# Altium footprint library PBL - THD Packages.PcbLib: 137 footprints (part 4 of 9)
Each footprint in its own frame and in the unit in brackets; x right, y up, seen from the top. Pads: shape width x height; smd on the part's side, far side on the other; paste and mask are expansions set on the pad; w line width, h text height; cw(c..) or ccw(c..) is an arc to the next point about the centre after c.
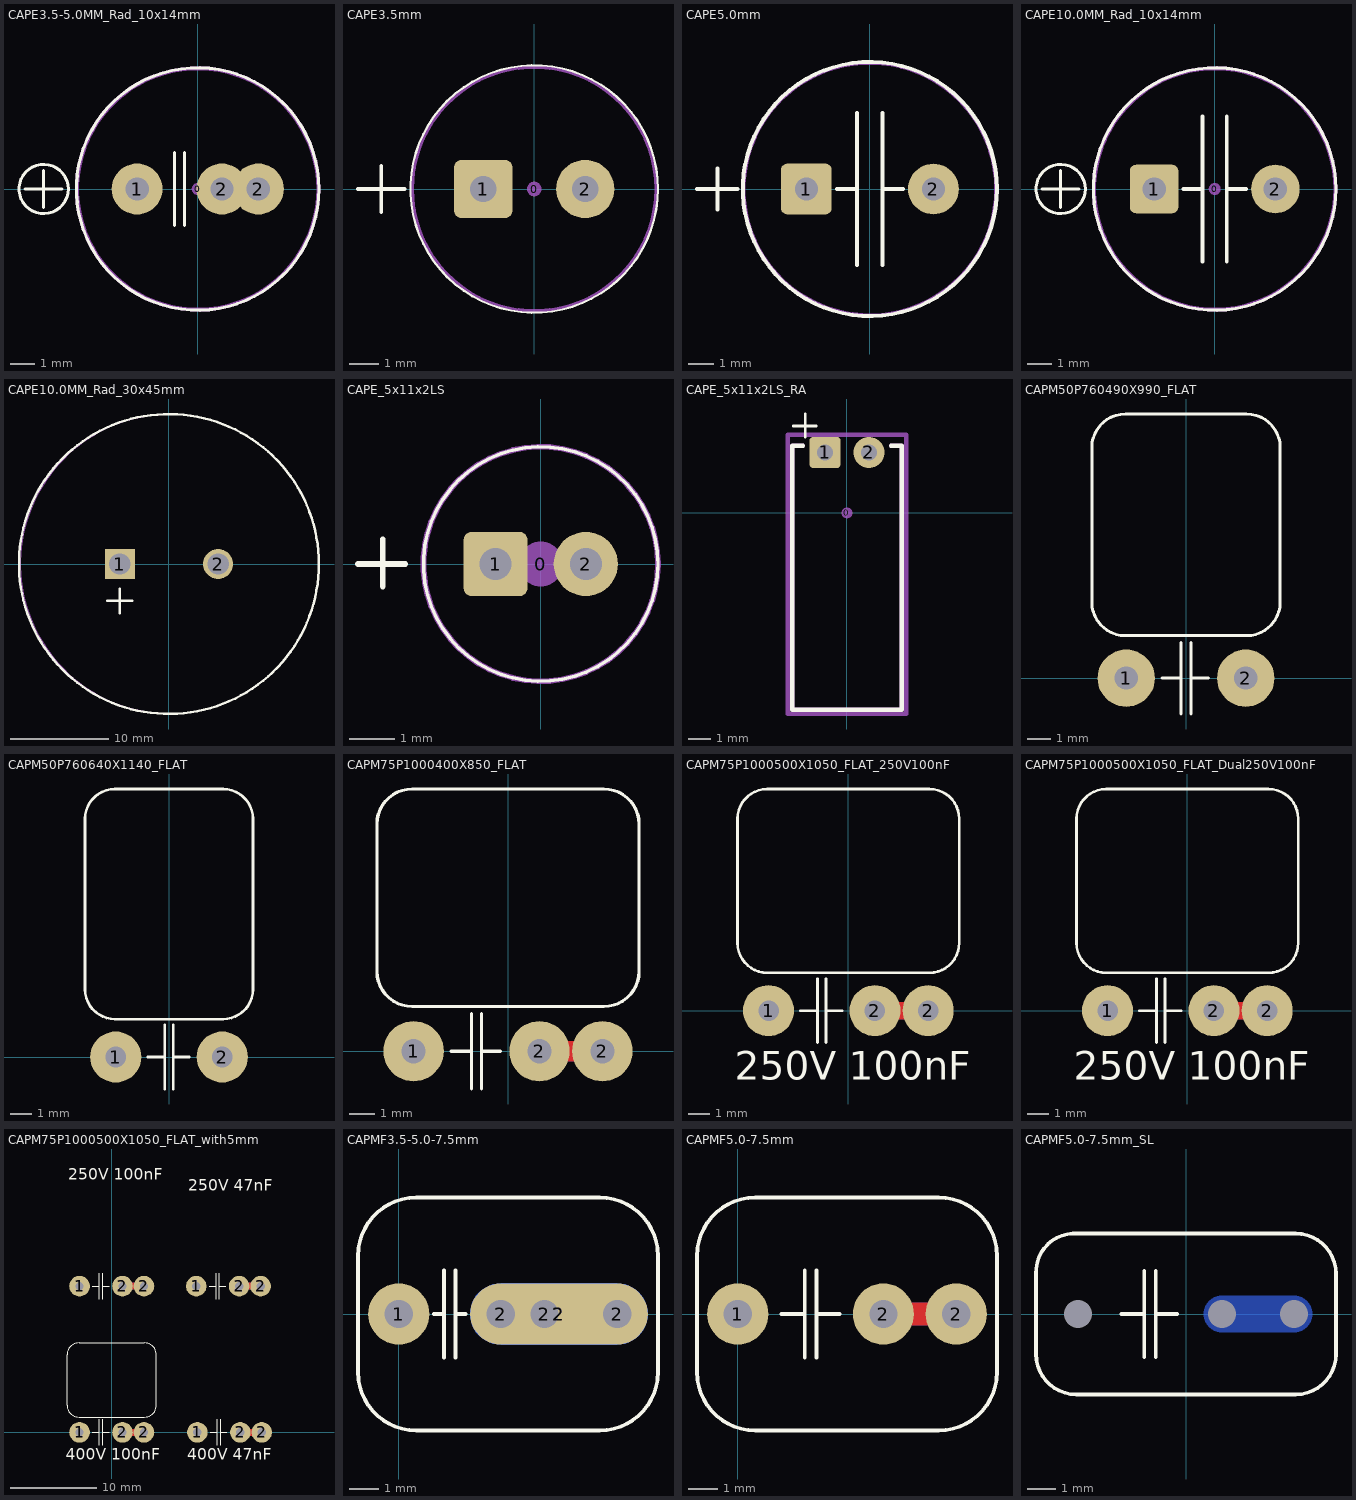
[diagram p3: the footprints below, top view; thin cyan lines are the x and y axes]

## CAPE3.5-5.0MM_Rad_10x14mm [mm] "3.5 & 5.0mm Pitch Radial Capacitor 10x14mm DxH"
height 14
pads (4):
  round 0.5 on Mech14: 0(0,0)
  round 2.1 hole 0.965: 1(-2.5,0) 2(1,0) 2(2.5,0)
Top Overlay:
  circle w0.127: c-6.35,0 r1.016
  circle w0.127: c0,0 r5
  lines w0.127: -7.112,0 -5.588,0 ; -6.35,-0.762 -6.35,0.762 ; -0.95,-1.5 -0.95,1.5 ; -0.55,-1.5 -0.55,1.5
13 - 3D:
  circle w0.127: c0,0 r4.953
14 - Courtyards Top:
  circle w0.127: c0,0 r5
3D body "ElectroCap10x14mm.stp": height 13.99, standoff -3.51, extent -5.25,-5.237 5.206,5.237

## CAPE3.5mm [mm]
pads (3):
  round 0.508 on Mech14: 0(0,0)
  rrect25% 2x2 hole 0.9: 1(-1.75,0)
  round 2 hole 0.9: 2(1.75,0)
Top Overlay:
  circle w0.076: c0,0 r4.25
  lines w0.127: -6.05,0 -4.45,0 ; -5.25,-0.8 -5.25,0.8
13 - 3D:
  circle w0.127: c0,0 r4.191
3D body: height 7.1, standoff 0.1, extent -4.25,-4.25 4.216,4.233

## CAPE5.0mm [mm]
height 20
pads (2):
  rrect25% 2x2 hole 0.9: 1(-2.5,0)
  round 2 hole 0.9: 2(2.5,0)
Top Overlay:
  circle w0.152: c0,0 r5
  lines w0.152: -6.8,0 -5.2,0 ; -6,-0.8 -6,0.8 ; -1.3,0 -0.5,0 ; -0.5,-3 -0.5,3 ; 0.5,-3 0.5,3 ; 0.5,0 1.3,0
13 - 3D:
  circle w0.127: c0,-0.003 r4.953
3D body "ElectroCap20x10mm.stp": height 20, standoff -3.5, extent -4.958,-4.968 4.953,4.961

## CAPE10.0MM_Rad_10x14mm [mm] "10mm Pitch Radial Capacitor 10x14mm DxH"
height 14
pads (3):
  round 0.5 on Mech14: 0(0,0)
  rrect25% 2x2 hole 0.965: 1(-2.5,0)
  round 2 hole 0.965: 2(2.5,0)
Top Overlay:
  circle w0.127: c0,0 r5
  circle w0.127: c-6.35,0 r1.016
  lines w0.127: -7.112,0 -5.588,0 ; -6.35,-0.762 -6.35,0.762
  lines w0.152: -1.3,0.003 -0.5,0.003 ; -0.5,-2.997 -0.5,3.003 ; 0.5,-2.997 0.5,3.003 ; 0.5,0.003 1.3,0.003
13 - 3D:
  circle w0.127: c0,0 r4.953
14 - Courtyards Top:
  circle w0.127: c0,0 r5
3D body "ElectroCap10x14mm.stp": height 13.99, standoff -3.51, extent -5.25,-5.249 5.25,5.25

## CAPE10.0MM_Rad_30x45mm [mil] "10mm Pitch Radial Capacitor"
height 1771.65
pads (2):
  rect 120x120 hole 86: 1(-196.85,0)
  round 120 hole 86: 2(196.85,0)
Top Overlay:
  circle w10: c0,0 r600.39
  lines w10: -246.06,-147.64 -147.64,-147.64 ; -196.85,-196.85 -196.85,-98.43
15 - Courtyards Bottom:
  circle w5: c3.15,0 r597.8
3D body "ElectroCap45x30mm.stp": height 1771.65, standoff -137.8, extent -590.54,-590.45 590.56,590.47

## CAPE_5x11x2LS [mil] "Capacitor, electrolytic, radial can"
height 433.07
pads (3):
  round 39.37 on Mech14: 0(0,0)
  rrect25% 56x56 hole 28: 1(-39.37,0)
  round 56 hole 28: 2(39.37,0)
Top Overlay:
  circle w3: c0,0 r102.36
  lines w5: -159.45,0 -118.11,0 ; -137.8,-19.68 -137.8,21.65
13 - 3D:
  circle w5: c0,0 r102.36
3D body "Cap, elec, radial, 5x11x2LS.STEP": height 433.07, standoff -86.61, extent -98.42,-98.42 98.43,98.43

## CAPE_5x11x2LS_RA [mil] "Capacitor, electrolytic, radial can, laid over"
height 196.85
pads (3):
  round 19.68 on Mech14: 0(0,0)
  rrect25% 56x56 hole 28: 1(-39.37,108.27)
  round 56 hole 28: 2(39.37,108.27)
Top Overlay:
  lines w5: -96.46,155.51 -55.12,155.51 ; -74.8,135.83 -74.8,177.17
  lines w7.87: -78.74,120.08 -98.43,120.08 -98.43,-352.36 0,-352.36 98.43,-352.36 98.43,120.08 78.74,120.08
13 - 3D:
  lines w7.87: -78.74,120.08 -98.43,120.08 -98.43,-352.36 0,-352.36 98.43,-352.36 98.43,120.08 78.74,120.08
14 - Courtyards Top:
  lines w7.87: -106.3,-360.24 106.3,-360.24 106.3,139.76 -106.3,139.76 -106.3,-360.24
3D body "Cap, elec, radial, 5x11x2LS, RA.STEP": height 200.79, standoff -86.61, extent -98.42,-352.24 98.43,118.12

## CAPM50P760490X990_FLAT [mm] "Capacitor, THT, Metallized Polyester Film with 7.2x4.5x9.5mm LxTxH"
height 4.9
pads (2):
  round 2.4 hole 0.965 unplated: 1(-2.5,0) 2(2.5,0)
Top Overlay:
  lines w0.127: -1,0 -0.2,0 ; -0.2,-1.5 -0.2,1.5 ; 0.2,-1.5 0.2,1.5 ; 0.2,0 0.95,0 ; -3.937,3.175 ccw(c-2.54,3.175) -2.54,1.778 2.54,1.778 ccw(c2.54,3.175) 3.937,3.175 3.937,9.652 ccw(c2.54,9.652) 2.54,11.049 -2.54,11.049 ccw(c-2.54,9.652) -3.937,9.652 -3.937,3.175
3D body "CAPM50P760490X990_FLAT.STEP": height 4.9, standoff -1.78, extent -3.8,-0.249 3.8,11

## CAPM50P760640X1140_FLAT [mm] "Capacitor, THT, Metallized Polyester Film with 6.0x11.0x7.2mm TxHxW"
height 6.4
pads (2):
  round 2.4 hole 0.965 unplated: 1(-2.5,0) 2(2.5,0)
Top Overlay:
  lines w0.127: -1,0 -0.2,0 ; -0.2,-1.5 -0.2,1.5 ; 0.2,-1.5 0.2,1.5 ; 0.2,0 0.95,0 ; -3.937,3.175 ccw(c-2.54,3.175) -2.54,1.778 2.54,1.778 ccw(c2.54,3.175) 3.937,3.175 3.937,11.176 ccw(c2.54,11.176) 2.54,12.573 -2.54,12.573 ccw(c-2.54,11.176) -3.937,11.176 -3.937,3.175
3D body "CAPM50P760640X1140_FLAT.STEP": height 6.4, standoff -1.78, extent -3.8,-0.249 3.8,12.5

## CAPM75P1000400X850_FLAT [mm] "Capacitor, THT, Metallized Polyester Film with 3.5x9.5x10.0mm TxHxW"
height 3.5
pads (3):
  round 2.4 hole 0.965 unplated: 1(-3.75,0) 2(1.25,0) 2(3.75,0)
Top Layer:
  lines w0.813: 1.25,0 3.75,0
Bottom Layer:
  lines w0.813: 1.25,0 3.75,0
Top Overlay:
  lines w0.127: -2.25,0 -1.45,0 ; -1.45,-1.5 -1.45,1.5 ; -1.05,-1.5 -1.05,1.5 ; -1.05,0 -0.3,0 ; -5.207,3.175 ccw(c-3.81,3.175) -3.81,1.778 3.81,1.778 ccw(c3.81,3.175) 5.207,3.175 5.207,9.017 ccw(c3.81,9.017) 3.81,10.414 -3.81,10.414 ccw(c-3.81,9.017) -5.207,9.017 -5.207,3.175
3D body "CAPM75P1000400X850_FLAT.STEP": height 4, standoff -1.78, extent -5,-0.249 5,9.6

## CAPM75P1000500X1050_FLAT_250V100nF [mm] "Capacitor, THT, Metallized Polyester Film with 3.5x9.5x10.0mm TxHxW"
height 3.5
pads (3):
  round 2.4 hole 0.965 unplated: 1(-3.75,0) 2(1.25,0) 2(3.75,0)
Top Layer:
  lines w0.813: 1.25,0 3.75,0
Bottom Layer:
  lines w0.813: 1.25,0 3.75,0
Top Overlay:
  lines w0.127: -2.25,0 -1.45,0 ; -1.45,-1.5 -1.45,1.5 ; -1.05,-1.5 -1.05,1.5 ; -1.05,0 -0.3,0 ; -5.207,3.175 ccw(c-3.81,3.175) -3.81,1.778 3.81,1.778 ccw(c3.81,3.175) 5.207,3.175 5.207,9.017 ccw(c3.81,9.017) 3.81,10.414 -3.81,10.414 ccw(c-3.81,9.017) -5.207,9.017 -5.207,3.175
  text "250V 100nF" at -5.334,-3.683 h2.29
3D body "CAPM75P1000400X850_FLAT.STEP": height 4, standoff -1.78, extent -5,-0.249 5,9.6
3D body "CAPM50P730450X950_FLAT.STEP": height 4.5, standoff -1.78, extent -4.92,-0.249 2.38,10.6

## CAPM75P1000500X1050_FLAT_Dual250V100nF [mm] "Capacitor, THT, Metallized Polyester Film with 3.5x9.5x10.0mm TxHxW"
height 3.5
pads (3):
  round 2.4 hole 0.965 unplated: 1(-3.75,0) 2(1.25,0) 2(3.75,0)
Top Layer:
  lines w0.813: 1.25,0 3.75,0
Bottom Layer:
  lines w0.813: 1.25,0 3.75,0
Top Overlay:
  lines w0.127: -2.25,0 -1.45,0 ; -1.45,-1.5 -1.45,1.5 ; -1.05,-1.5 -1.05,1.5 ; -1.05,0 -0.3,0 ; -5.207,3.175 ccw(c-3.81,3.175) -3.81,1.778 3.81,1.778 ccw(c3.81,3.175) 5.207,3.175 5.207,9.017 ccw(c3.81,9.017) 3.81,10.414 -3.81,10.414 ccw(c-3.81,9.017) -5.207,9.017 -5.207,3.175
  text "250V 100nF" at -5.334,-3.683 h2.29
3D body "CAPMUC75P900420X810_FLAT.STEP": height 4.2, standoff -1.78, extent -4.5,-0.249 4.5,9.6
3D body "CAPMUC50P650570X860_FLAT.STEP": height 5.7, standoff -1.78, extent -4.5,-0.249 2,10.1
3D body "CAPM50P760540X1040_FLAT.STEP": height 5.4, standoff -1.78, extent -5.05,-0.249 2.55,11.5
3D body "CAPM50P730450X950_FLAT.STEP": height 4.5, standoff -1.78, extent -4.9,-0.249 2.4,10.6
3D body "CAPM75P1000400X850_FLAT.STEP": height 4, standoff -1.78, extent -5,-0.249 5,9.6

## CAPM75P1000500X1050_FLAT_with5mm [mm] "Capacitor, THT, Metallized Polyester Film with 3.5x9.5x10.0mm TxHxW"
height 3.5
pads (12):
  round 2.4 hole 0.965 unplated: 1(-3.75,0) 1(-3.75,17.018) 1(9.839,17.018) 1(9.966,0) 2(1.25,0) 2(1.25,17.018) 2(3.75,0) 2(3.75,17.018) 2(14.839,17.018) 2(14.966,0) 2(17.339,17.018) 2(17.466,0)
Top Layer:
  lines w0.813: 1.25,0 3.75,0 ; 1.25,17.018 3.75,17.018 ; 14.839,17.018 17.339,17.018 ; 14.966,0 17.466,0
Bottom Layer:
  lines w0.813: 1.25,0 3.75,0 ; 1.25,17.018 3.75,17.018 ; 14.839,17.018 17.339,17.018 ; 14.966,0 17.466,0
Top Overlay:
  lines w0.127: -2.25,0 -1.45,0 ; -2.25,17.018 -1.45,17.018 ; -1.45,-1.5 -1.45,1.5 ; -1.45,15.518 -1.45,18.518 ; -1.05,-1.5 -1.05,1.5 ; -1.05,0 -0.3,0 ; -1.05,15.518 -1.05,18.518 ; -1.05,17.018 -0.3,17.018 ; 11.339,17.018 12.139,17.018 ; 11.466,0 12.266,0 ; 12.139,15.518 12.139,18.518 ; 12.266,-1.5 12.266,1.5 ; 12.539,15.518 12.539,18.518 ; 12.539,17.018 13.289,17.018 ; 12.666,-1.5 12.666,1.5 ; 12.666,0 13.416,0 ; -5.207,3.175 ccw(c-3.81,3.175) -3.81,1.778 3.81,1.778 ccw(c3.81,3.175) 5.207,3.175 5.207,9.017 ccw(c3.81,9.017) 3.81,10.414 -3.81,10.414 ccw(c-3.81,9.017) -5.207,9.017 -5.207,3.175
  text "400V 100nF" at -5.334,-3.683 h2.29
  text "400V 47nF" at 8.763,-3.683 h2.29
  text "250V 100nF" at -5.08,28.956 h2.29
  text "250V 47nF" at 8.89,27.686 h2.29
3D body "CAPM75P1000400X850_FLAT.STEP": height 4, standoff -1.78, extent -5,16.769 5,26.618
3D body "CAPM50P730450X950_FLAT.STEP": height 4.5, standoff -1.78, extent -4.92,16.769 2.38,27.618
3D body "CAPM50P720350X800_FLAT.STEP": height 3.5, standoff -1.78, extent 8.719,16.769 15.919,26.118
3D body "CAPM75P1000250X700_FLAT.STEP": height 2.5, standoff -1.78, extent 8.589,16.769 18.589,25.118
3D body "CAPM75P1000400X850_FLAT.STEP": height 4, standoff -1.78, extent 8.716,-0.249 18.716,9.6
3D body "CAPM50P730450X950_FLAT.STEP": height 4.5, standoff -1.78, extent 8.796,-0.249 16.096,10.6
3D body "CAPM75P1000500X1050_FLAT.STEP": height 5, standoff -1.78, extent -5,-0.249 5,11.6
3D body "CAPM50P780780X1300_FLAT.STEP": height 7.8, standoff -1.78, extent -5.17,-0.249 2.63,14.1

## CAPMF3.5-5.0-7.5mm [mm] "Capacitor, THT, Metallized Polyester Film, 3.5 & 5.0 & 7.5mm pitch hybrid"
height 10
pads (6):
  round 2.1 hole 0.965: 1(0,0)
  round 1.5 hole 0.965: 2(3.5,0) 2(5,0) 2(7.5,0)
  oval 6.1x2.1 smd: 2(5.5,0)
  oval 6.1x2.1 smd far side: 2(5.5,0)
Top Overlay:
  lines w0.127: 1.2,0 1.55,0 ; 1.55,-1.5 1.55,1.5 ; 1.95,-1.5 1.95,1.5 ; 1.95,0 2.3,0 ; -1.4,-2 ccw(c0.6,-2) 0.6,-4 6.9,-4 ccw(c6.9,-2) 8.9,-2 8.9,2 ccw(c6.9,2) 6.9,4 0.6,4 ccw(c0.6,2) -1.4,2 -1.4,-2
3D body "mfcap_7.5mm 10x8x11mm.stp": height 11, standoff -2.54, extent -1.25,-4 8.75,4

## CAPMF5.0-7.5mm [mm] "Capacitor, THT, Metallized Polyester Film, 5 & 7.5mm pitch hybrid"
height 10
pads (3):
  round 2.1 hole 0.965: 1(0,0) 2(5,0) 2(7.5,0)
Top Layer:
  lines w0.8: 5,0 7.5,0
Bottom Layer:
  lines w0.8: 5,0 7.5,0
Top Overlay:
  lines w0.127: 1.5,0 2.3,0 ; 2.3,-1.5 2.3,1.5 ; 2.7,-1.5 2.7,1.5 ; 2.7,0 3.5,0 ; -1.4,-2 ccw(c0.6,-2) 0.6,-4 6.9,-4 ccw(c6.9,-2) 8.9,-2 8.9,2 ccw(c6.9,2) 6.9,4 0.6,4 ccw(c0.6,2) -1.4,2 -1.4,-2
3D body "mfcap_7.5mm 10x8x11mm.stp": height 11, standoff -2.54, extent -1.25,-4 8.75,4

## CAPMF5.0-7.5mm_SL [mil] "Capacitor, THT, Metallized Polyester Film"
height 354.33
pads (3):
  round 0 / inner round 0 / far side round 94.49 hole 38 unplated: 1(-147.64,0) 2(49.21,0) 2(147.64,0)
Bottom Layer:
  lines w50: 49.21,0 147.64,0
Top Overlay:
  lines w5: -88.58,0 -57.09,0 ; -57.09,-59.06 -57.09,59.06 ; -41.34,-59.06 -41.34,59.06 ; -41.34,0 -11.81,0 ; -205,-55 ccw(c-150,-55) -150,-110 150,-110 ccw(c150,-55) 205,-55 205,55 ccw(c150,55) 150,110 -155,110 ccw(c-152.5,57.5) -205,55 -205,-55
3D body "CAPF_6.0x9.0x10.5 TxHxW 7.5mmLS.STEP": height 354.33, standoff -100, extent -206.69,-118.1 206.7,118.12